# Altium footprint library Cty1.PcbLib: 1378 footprints (part 32 of 87)
Each footprint in its own frame and in the unit in brackets; x right, y up, seen from the top. Pads: shape width x height; smd on the part's side, far side on the other; paste and mask are expansions set on the pad; w line width, h text height; cw(c..) or ccw(c..) is an arc to the next point about the centre after c.
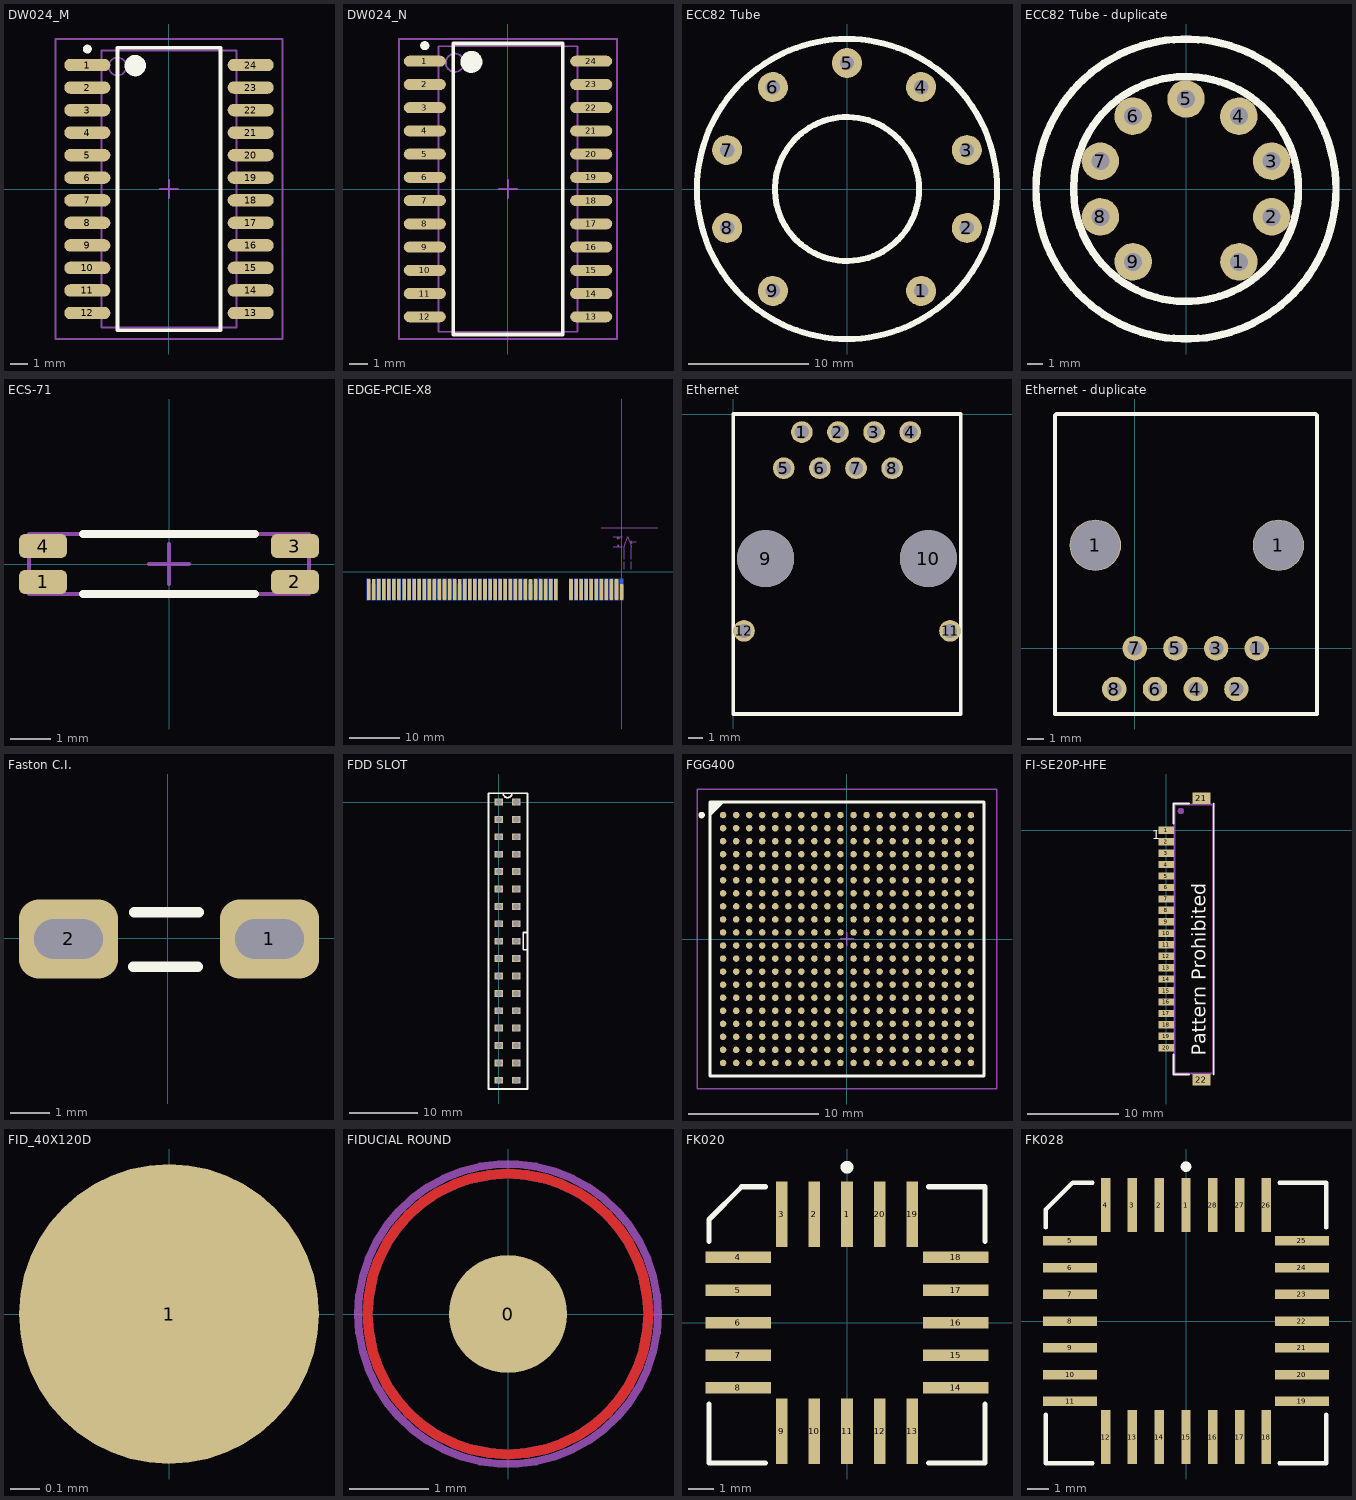
[diagram p31: the footprints below, top view; thin cyan lines are the x and y axes]

## DW024_M [mm] "SOIC, 24-Leads, Body 15.4x7.5mm, Pitch 1.27mm, IPC Low Density"
height 2.65
pads (24):
  oval 2.6x0.7 smd: 1(-4.6,6.985) 2(-4.6,5.715) 3(-4.6,4.445) 4(-4.6,3.175) 5(-4.6,1.905) 6(-4.6,0.635) 7(-4.6,-0.635) 8(-4.6,-1.905) 9(-4.6,-3.175) 10(-4.6,-4.445) 11(-4.6,-5.715) 12(-4.6,-6.985) 13(4.6,-6.985) 14(4.6,-5.715) 15(4.6,-4.445) 16(4.6,-3.175) 17(4.6,-1.905) 18(4.6,-0.635) 19(4.6,0.635) 20(4.6,1.905) 21(4.6,3.175) 22(4.6,4.445) 23(4.6,5.715) 24(4.6,6.985)
Top Overlay:
  circle w0.25: c-4.6,7.885 r0.125
  circle w0.6: c-1.9,6.95 r0.3
  lines w0.2: -2.9,-7.95 -2.9,7.95 2.9,7.95 2.9,-7.95 -2.9,-7.95
Mechanical 13:
  circle w0.1: c-2.9,6.9 r0.5
  lines w0.1: -3.8,-7.8 -3.8,7.8 3.8,7.8 3.8,-7.8 -3.8,-7.8
Mechanical 15:
  lines w0.1: -0.5,0 0.5,0 ; 0,-0.5 0,0.5 ; -6.4,-8.45 -6.4,8.45 6.4,8.45 6.4,-8.45 -6.4,-8.45
3D body: height 2.65, standoff 0, extent -3.8,-7.8 3.8,7.8

## DW024_N [mm] "SOIC, 24-Leads, Body 15.4x7.5mm, Pitch 1.27mm, IPC Medium Density"
height 2.65
pads (24):
  oval 2.3x0.6 smd: 1(-4.55,6.985) 2(-4.55,5.715) 3(-4.55,4.445) 4(-4.55,3.175) 5(-4.55,1.905) 6(-4.55,0.635) 7(-4.55,-0.635) 8(-4.55,-1.905) 9(-4.55,-3.175) 10(-4.55,-4.445) 11(-4.55,-5.715) 12(-4.55,-6.985) 13(4.55,-6.985) 14(4.55,-5.715) 15(4.55,-4.445) 16(4.55,-3.175) 17(4.55,-1.905) 18(4.55,-0.635) 19(4.55,0.635) 20(4.55,1.905) 21(4.55,3.175) 22(4.55,4.445) 23(4.55,5.715) 24(4.55,6.985)
Top Overlay:
  circle w0.6: c-2,6.95 r0.3
  circle w0.25: c-4.55,7.835 r0.125
  lines w0.2: -3,-7.95 3,-7.95 3,7.95 -3,7.95 -3,-7.95
Mechanical 13:
  circle w0.1: c-2.9,6.9 r0.5
  lines w0.1: -3.8,-7.8 3.8,-7.8 3.8,7.8 -3.8,7.8 -3.8,-7.8
Mechanical 15:
  lines w0.1: -0.5,0 0.5,0 ; 0,-0.5 0,0.5 ; -5.95,-8.2 5.95,-8.2 5.95,8.2 -5.95,8.2 -5.95,-8.2
3D body: height 2.65, standoff 0, extent -3.8,-7.8 3.8,7.8

## ECC82 Tube [mm]
pads (9):
  round 2.5 hole 1.2: 1(6.172,-8.495) 2(9.986,-3.245) 3(9.986,3.245) 4(6.172,8.495) 5(0,10.5) 6(-6.172,8.495) 7(-9.986,3.245) 8(-9.986,-3.245) 9(-6.172,-8.495)
Top Overlay:
  circle w0.5: c0,0 r12.5
  circle w0.5: c0,0 r6
3D body "Part26.STEP": height 70.12, standoff -5.7, extent -12.5,-12.5 12.5,12.5

## ECC82 Tube - duplicate [mm]
pads (9):
  round 2.5 hole 1.2: 1(3.527,-4.854) 2(5.706,-1.854) 3(5.706,1.854) 4(3.527,4.854) 5(0,6) 6(-3.527,4.854) 7(-5.706,1.854) 8(-5.706,-1.854) 9(-3.527,-4.854)
Top Overlay:
  circle w0.5: c0,0 r10
  circle w0.5: c0,0 r7.5
3D body "Part24.STEP": height 67.12, standoff -4.8, extent -12.5,-12.5 12.5,12.5

## ECS-71 [mm]
pads (4):
  rrect50% 1.2x0.6 smd: 1(-3.15,-0.45) 2(3.15,-0.45) 3(3.15,0.45) 4(-3.15,0.45)
Top Overlay:
  lines w0.2: -2.15,-0.75 2.15,-0.75 ; -2.15,0.75 2.15,0.75
Mechanical 13:
  lines w0.1: -3.5,-0.75 3.5,-0.75 3.5,0.75 -3.5,0.75 -3.5,-0.75
Mechanical 15:
  lines w0.1: -0.5,0 0.5,0 ; 0,-0.5 0,0.5
3D body: height 1.41, standoff 1.39, extent 1.617,-0.465 2.676,0.536
3D body: height 1.41, standoff 1.39, extent -2.76,-0.49 -1.701,0.511
3D body: height 0.3, standoff 0, extent 3.162,-0.676 3.553,-0.396
3D body: height 0.3, standoff 0, extent 3.162,0.389 3.553,0.668
3D body: height 0.3, standoff 0, extent -3.574,-0.681 -3.183,-0.401
3D body: height 0.3, standoff 0, extent -3.589,0.389 -3.198,0.668
3D body: height 1.4, standoff 0, extent -3.556,-0.749 3.414,0.737

## EDGE-PCIE-X8 [mm]
pads (98):
  rrect50% 0.7x3.2 smd paste-3.2: A1(0,-4)
  rrect50% 0.7x4.2 smd paste-4.2: A2(-1,-3.5) A3(-2,-3.5) A4(-3,-3.5) A5(-4,-3.5) A6(-5,-3.5) A7(-6,-3.5) A8(-7,-3.5) A9(-8,-3.5) A10(-9,-3.5) A11(-10,-3.5) A12(-13,-3.5) A13(-14,-3.5) A14(-15,-3.5) A15(-16,-3.5) A16(-17,-3.5) A17(-18,-3.5) A18(-19,-3.5) A19(-20,-3.5) A20(-21,-3.5) A21(-22,-3.5) A22(-23,-3.5) A23(-24,-3.5) A24(-25,-3.5) A25(-26,-3.5) A26(-27,-3.5) A27(-28,-3.5) A28(-29,-3.5) A29(-30,-3.5) A30(-31,-3.5) A31(-32,-3.5) A32(-33,-3.5) A33(-34,-3.5) A34(-35,-3.5) A35(-36,-3.5) A36(-37,-3.5) A37(-38,-3.5) A38(-39,-3.5) A39(-40,-3.5) A40(-41,-3.5) A41(-42,-3.5) A42(-43,-3.5) A43(-44,-3.5) A44(-45,-3.5) A45(-46,-3.5) A46(-47,-3.5) A47(-48,-3.5) A48(-49,-3.5) A49(-50,-3.5)
  rrect0% 0.7x4.2 smd far side paste-4.2: B1(0,-3.5) B2(-1,-3.5) B3(-2,-3.5) B4(-3,-3.5) B5(-4,-3.5) B6(-5,-3.5) B7(-6,-3.5) B8(-7,-3.5) B9(-8,-3.5) B10(-9,-3.5) B11(-10,-3.5) B12(-13,-3.5) B13(-14,-3.5) B14(-15,-3.5) B15(-16,-3.5) B16(-17,-3.5) B18(-19,-3.5) B19(-20,-3.5) B20(-21,-3.5) B21(-22,-3.5) B22(-23,-3.5) B23(-24,-3.5) B24(-25,-3.5) B25(-26,-3.5) B26(-27,-3.5) B27(-28,-3.5) B28(-29,-3.5) B29(-30,-3.5) B30(-31,-3.5) B32(-33,-3.5) B33(-34,-3.5) B34(-35,-3.5) B35(-36,-3.5) B36(-37,-3.5) B37(-38,-3.5) B38(-39,-3.5) B39(-40,-3.5) B40(-41,-3.5) B41(-42,-3.5) B42(-43,-3.5) B43(-44,-3.5) B44(-45,-3.5) B45(-46,-3.5) B46(-47,-3.5) B47(-48,-3.5) B49(-50,-3.5)
  rrect0% 0.7x3.2 smd far side paste-3.2: B17(-18,-4) B31(-32,-4) B48(-49,-4)
Mechanical 1:
  lines w0.127: -4,8.7 7.2,8.7 ; -1.6,5 0.1,5 ; -1.6,6.9 0.1,6.9 ; -0.9,5.3 -0.7,5.1 ; -0.9,6.6 -0.7,6.8 ; -0.7,5.4 -0.7,5.1 ; -0.7,6.4 -0.7,6.8 ; -0.5,5.3 -0.7,5.1 ; -0.5,6.6 -0.7,6.8 ; 0.5,0.5 0.5,2 ; 0.5,2.5 0.5,5 1.194,6.908 ; 1.207,6.903 1.9,5 1.9,2.5 ; 1.9,0.5 1.9,2 ; 2,5.7 1.8,5.9 ; 2,6.1 1.8,5.9 ; 2.9,5.9 1.8,5.9 ; -0.7,5 -0.7,5
  text "Edge Connector Side View" at -4,8.3 h1
  text "20° ± 5°" at 3.1,6.2 h1
  text "1.4mm" at -2.5,6.2 h1
  text "Board Thickness =1.57 ± 0.10 mm" at 2.5,1.5 h1

## Ethernet [mil] "jac ethernet"
height 551.18
pads (12):
  round 60 hole 39.37: 1(190,-50) 2(290,-50) 3(390,-50) 4(490,-50) 5(140,-150) 6(240,-150) 7(340,-150) 8(440,-150) 11(600,-600) 12(30,-600)
  round 157.48 hole 157.48: 9(90,-400) 10(540,-400)
Top Overlay:
  lines w10: 0,-830 630,-830 630,0 0,0 0,-830

## Ethernet - duplicate [mm]
pads (10):
  round 3.2 hole 3.1: 1(-2.455,6.43) 1(8.975,6.43)
  round 1.524 hole 0.9: 1(7.62,0) 2(6.35,-2.54) 3(5.08,0) 4(3.81,-2.54) 5(2.54,0) 6(1.27,-2.54) 7(0,0) 8(-1.27,-2.54)
Top Overlay:
  lines w0.254: -4.975,-4.1 11.383,-4.1 11.383,14.522 11.279,14.625 3.575,14.625 -4.872,14.625 -4.975,14.522 -4.975,-4.1
3D body "SW3dPS-432028816.STEP": height 12.43, standoff -3.34, extent -4.975,-4.122 11.383,14.522

## Faston C.I. [mm]
pads (2):
  rrect50% 2.5x2 hole 1 slot 1.73 at 0 deg: 1(2.575,-0.025) 2(-2.5,-0.025)
Top Overlay:
  lines w0.254: -0.875,-0.725 0.775,-0.725 ; -0.85,0.65 0.8,0.65
3D body "amp faston tab 63824.step": height 11.52, standoff -2.5, extent -3.925,-1.57 3.995,1.52

## FDD SLOT [mm] "Khe cam cap o dia mem"
pads (34):
  rect 1.27x1 hole 0.889: 1(0,0) 2(0,-2.54) 3(0,-5.08) 4(0,-7.62) 5(0,-10.16) 6(0,-12.7) 7(0,-15.24) 8(0,-17.78) 9(0,-20.32) 10(0,-22.86) 11(0,-25.4) 12(0,-27.94) 13(0,-30.48) 14(0,-33.02) 15(0,-35.56) 16(0,-38.1) 17(0,-40.64) 18(2.54,-40.64) 19(2.54,-38.1) 20(2.54,-35.56) 21(2.54,-33.02) 22(2.54,-30.48) 23(2.54,-27.94) 24(2.54,-25.4) 25(2.54,-22.86) 26(2.54,-20.32) 27(2.54,-17.78) 28(2.54,-15.24) 29(2.54,-12.7) 30(2.54,-10.16) 31(2.54,-7.62) 32(2.54,-5.08) 33(2.54,-2.54) 34(2.54,0)
Top Overlay:
  lines w0.254: 4.191,-21.59 3.556,-21.59 3.556,-19.05 4.191,-19.05 ; -1.524,-41.91 4.191,-41.91 4.191,1.27 1.524,1.27 0.635,1.27 ccw(c1.27,1.27) 1.905,1.27 1.016,1.27 -1.524,1.27 -1.524,-41.91

## FGG400 [mm]
pads (400):
  round 0.5 smd: A1(-9.5,9.5) A2(-8.5,9.5) A3(-7.5,9.5) A4(-6.5,9.5) A5(-5.5,9.5) A6(-4.5,9.5) A7(-3.5,9.5) A8(-2.5,9.5) A9(-1.5,9.5) A10(-0.5,9.5) A11(0.5,9.5) A12(1.5,9.5) A13(2.5,9.5) A14(3.5,9.5) A15(4.5,9.5) A16(5.5,9.5) A17(6.5,9.5) A18(7.5,9.5) A19(8.5,9.5) A20(9.5,9.5) B1(-9.5,8.5) B2(-8.5,8.5) B3(-7.5,8.5) B4(-6.5,8.5) B5(-5.5,8.5) B6(-4.5,8.5) B7(-3.5,8.5) B8(-2.5,8.5) B9(-1.5,8.5) B10(-0.5,8.5) B11(0.5,8.5) B12(1.5,8.5) B13(2.5,8.5) B14(3.5,8.5) B15(4.5,8.5) B16(5.5,8.5) B17(6.5,8.5) B18(7.5,8.5) B19(8.5,8.5) B20(9.5,8.5) C1(-9.5,7.5) C2(-8.5,7.5) C3(-7.5,7.5) C4(-6.5,7.5) C5(-5.5,7.5) C6(-4.5,7.5) C7(-3.5,7.5) C8(-2.5,7.5) C9(-1.5,7.5) C10(-0.5,7.5) C11(0.5,7.5) C12(1.5,7.5) C13(2.5,7.5) C14(3.5,7.5) C15(4.5,7.5) C16(5.5,7.5) C17(6.5,7.5) C18(7.5,7.5) C19(8.5,7.5) C20(9.5,7.5) D1(-9.5,6.5) D2(-8.5,6.5) D3(-7.5,6.5) D4(-6.5,6.5) D5(-5.5,6.5) D6(-4.5,6.5) D7(-3.5,6.5) D8(-2.5,6.5) D9(-1.5,6.5) D10(-0.5,6.5) D11(0.5,6.5) D12(1.5,6.5) D13(2.5,6.5) D14(3.5,6.5) D15(4.5,6.5) D16(5.5,6.5) D17(6.5,6.5) D18(7.5,6.5) D19(8.5,6.5) D20(9.5,6.5) E1(-9.5,5.5) E2(-8.5,5.5) E3(-7.5,5.5) E4(-6.5,5.5) E5(-5.5,5.5) E6(-4.5,5.5) E7(-3.5,5.5) E8(-2.5,5.5) E9(-1.5,5.5) E10(-0.5,5.5) E11(0.5,5.5) E12(1.5,5.5) E13(2.5,5.5) E14(3.5,5.5) E15(4.5,5.5) E16(5.5,5.5) E17(6.5,5.5) E18(7.5,5.5) E19(8.5,5.5) E20(9.5,5.5) F1(-9.5,4.5) F2(-8.5,4.5) F3(-7.5,4.5) F4(-6.5,4.5) F5(-5.5,4.5) F6(-4.5,4.5) F7(-3.5,4.5) F8(-2.5,4.5) F9(-1.5,4.5) F10(-0.5,4.5) F11(0.5,4.5) F12(1.5,4.5) F13(2.5,4.5) F14(3.5,4.5) F15(4.5,4.5) F16(5.5,4.5) F17(6.5,4.5) F18(7.5,4.5) F19(8.5,4.5) F20(9.5,4.5) G1(-9.5,3.5) G2(-8.5,3.5) G3(-7.5,3.5) G4(-6.5,3.5) G5(-5.5,3.5) G6(-4.5,3.5) G7(-3.5,3.5) G8(-2.5,3.5) G9(-1.5,3.5) G10(-0.5,3.5) G11(0.5,3.5) G12(1.5,3.5) G13(2.5,3.5) G14(3.5,3.5) G15(4.5,3.5) G16(5.5,3.5) G17(6.5,3.5) G18(7.5,3.5) G19(8.5,3.5) G20(9.5,3.5) H1(-9.5,2.5) H2(-8.5,2.5) H3(-7.5,2.5) H4(-6.5,2.5) H5(-5.5,2.5) H6(-4.5,2.5) H7(-3.5,2.5) H8(-2.5,2.5) H9(-1.5,2.5) H10(-0.5,2.5) H11(0.5,2.5) H12(1.5,2.5) H13(2.5,2.5) H14(3.5,2.5) H15(4.5,2.5) H16(5.5,2.5) H17(6.5,2.5) H18(7.5,2.5) H19(8.5,2.5) H20(9.5,2.5) J1(-9.5,1.5) J2(-8.5,1.5) J3(-7.5,1.5) J4(-6.5,1.5) J5(-5.5,1.5) J6(-4.5,1.5) J7(-3.5,1.5) J8(-2.5,1.5) J9(-1.5,1.5) J10(-0.5,1.5) J11(0.5,1.5) J12(1.5,1.5) J13(2.5,1.5) J14(3.5,1.5) J15(4.5,1.5) J16(5.5,1.5) J17(6.5,1.5) J18(7.5,1.5) J19(8.5,1.5) J20(9.5,1.5) K1(-9.5,0.5) K2(-8.5,0.5) K3(-7.5,0.5) K4(-6.5,0.5) K5(-5.5,0.5) K6(-4.5,0.5) K7(-3.5,0.5) K8(-2.5,0.5) K9(-1.5,0.5) K10(-0.5,0.5) K11(0.5,0.5) K12(1.5,0.5) K13(2.5,0.5) K14(3.5,0.5) K15(4.5,0.5) K16(5.5,0.5) K17(6.5,0.5) K18(7.5,0.5) K19(8.5,0.5) K20(9.5,0.5) L1(-9.5,-0.5) L2(-8.5,-0.5) L3(-7.5,-0.5) L4(-6.5,-0.5) L5(-5.5,-0.5) L6(-4.5,-0.5) L7(-3.5,-0.5) L8(-2.5,-0.5) L9(-1.5,-0.5) L10(-0.5,-0.5) L11(0.5,-0.5) L12(1.5,-0.5) L13(2.5,-0.5) L14(3.5,-0.5) L15(4.5,-0.5) L16(5.5,-0.5) L17(6.5,-0.5) L18(7.5,-0.5) L19(8.5,-0.5) L20(9.5,-0.5) M1(-9.5,-1.5) M2(-8.5,-1.5) M3(-7.5,-1.5) M4(-6.5,-1.5) M5(-5.5,-1.5) M6(-4.5,-1.5) M7(-3.5,-1.5) M8(-2.5,-1.5) M9(-1.5,-1.5) M10(-0.5,-1.5) M11(0.5,-1.5) M12(1.5,-1.5) M13(2.5,-1.5) M14(3.5,-1.5) M15(4.5,-1.5) M16(5.5,-1.5) M17(6.5,-1.5) M18(7.5,-1.5) M19(8.5,-1.5) M20(9.5,-1.5) N1(-9.5,-2.5) N2(-8.5,-2.5) N3(-7.5,-2.5) N4(-6.5,-2.5) N5(-5.5,-2.5) N6(-4.5,-2.5) N7(-3.5,-2.5) N8(-2.5,-2.5) N9(-1.5,-2.5) N10(-0.5,-2.5) N11(0.5,-2.5) N12(1.5,-2.5) N13(2.5,-2.5) N14(3.5,-2.5) N15(4.5,-2.5) N16(5.5,-2.5) N17(6.5,-2.5) N18(7.5,-2.5) N19(8.5,-2.5) N20(9.5,-2.5) P1(-9.5,-3.5) P2(-8.5,-3.5) P3(-7.5,-3.5) P4(-6.5,-3.5) P5(-5.5,-3.5) P6(-4.5,-3.5) P7(-3.5,-3.5) P8(-2.5,-3.5) P9(-1.5,-3.5) P10(-0.5,-3.5) P11(0.5,-3.5) P12(1.5,-3.5) P13(2.5,-3.5) P14(3.5,-3.5) P15(4.5,-3.5) P16(5.5,-3.5) P17(6.5,-3.5) P18(7.5,-3.5) P19(8.5,-3.5) P20(9.5,-3.5) R1(-9.5,-4.5) R2(-8.5,-4.5) R3(-7.5,-4.5) R4(-6.5,-4.5) R5(-5.5,-4.5) R6(-4.5,-4.5) R7(-3.5,-4.5) R8(-2.5,-4.5) R9(-1.5,-4.5) R10(-0.5,-4.5) R11(0.5,-4.5) R12(1.5,-4.5) R13(2.5,-4.5) R14(3.5,-4.5) R15(4.5,-4.5) R16(5.5,-4.5) R17(6.5,-4.5) R18(7.5,-4.5) R19(8.5,-4.5) R20(9.5,-4.5) T1(-9.5,-5.5) T2(-8.5,-5.5) T3(-7.5,-5.5) T4(-6.5,-5.5) T5(-5.5,-5.5) T6(-4.5,-5.5) T7(-3.5,-5.5) T8(-2.5,-5.5) T9(-1.5,-5.5) T10(-0.5,-5.5) T11(0.5,-5.5) T12(1.5,-5.5) T13(2.5,-5.5) T14(3.5,-5.5) T15(4.5,-5.5) T16(5.5,-5.5) T17(6.5,-5.5) T18(7.5,-5.5) T19(8.5,-5.5) T20(9.5,-5.5) U1(-9.5,-6.5) U2(-8.5,-6.5) U3(-7.5,-6.5) U4(-6.5,-6.5) U5(-5.5,-6.5) U6(-4.5,-6.5) U7(-3.5,-6.5) U8(-2.5,-6.5) U9(-1.5,-6.5) U10(-0.5,-6.5) U11(0.5,-6.5) U12(1.5,-6.5) U13(2.5,-6.5) U14(3.5,-6.5) U15(4.5,-6.5) U16(5.5,-6.5) U17(6.5,-6.5) U18(7.5,-6.5) U19(8.5,-6.5) U20(9.5,-6.5) V1(-9.5,-7.5) V2(-8.5,-7.5) V3(-7.5,-7.5) V4(-6.5,-7.5) V5(-5.5,-7.5) V6(-4.5,-7.5) V7(-3.5,-7.5) V8(-2.5,-7.5) V9(-1.5,-7.5) V10(-0.5,-7.5) V11(0.5,-7.5) V12(1.5,-7.5) V13(2.5,-7.5) V14(3.5,-7.5) V15(4.5,-7.5) V16(5.5,-7.5) V17(6.5,-7.5) V18(7.5,-7.5) V19(8.5,-7.5) V20(9.5,-7.5) W1(-9.5,-8.5) W2(-8.5,-8.5) W3(-7.5,-8.5) W4(-6.5,-8.5) W5(-5.5,-8.5) W6(-4.5,-8.5) W7(-3.5,-8.5) W8(-2.5,-8.5) W9(-1.5,-8.5) W10(-0.5,-8.5) W11(0.5,-8.5) W12(1.5,-8.5) W13(2.5,-8.5) W14(3.5,-8.5) W15(4.5,-8.5) W16(5.5,-8.5) W17(6.5,-8.5) W18(7.5,-8.5) W19(8.5,-8.5) W20(9.5,-8.5) Y1(-9.5,-9.5) Y2(-8.5,-9.5) Y3(-7.5,-9.5) Y4(-6.5,-9.5) Y5(-5.5,-9.5) Y6(-4.5,-9.5) Y7(-3.5,-9.5) Y8(-2.5,-9.5) Y9(-1.5,-9.5) Y10(-0.5,-9.5) Y11(0.5,-9.5) Y12(1.5,-9.5) Y13(2.5,-9.5) Y14(3.5,-9.5) Y15(4.5,-9.5) Y16(5.5,-9.5) Y17(6.5,-9.5) Y18(7.5,-9.5) Y19(8.5,-9.5) Y20(9.5,-9.5)
Top Overlay:
  circle w0.25: c-11.15,9.5 r0.125
  region: -9.5,10.5 -10.5,9.5 -10.5,10.5
  lines w0.2: -10.5,9.5 -9.5,10.5 ; -10.5,-10.5 -10.5,10.5 10.5,10.5 10.5,-10.5 -10.5,-10.5
Mechanical 13:
  lines w0.1: -10.5,-10.5 10.5,-10.5 10.5,10.5 -10.5,10.5 -10.5,-10.5
Mechanical 15:
  lines w0.1: -0.5,0 0.5,0 ; 0,-0.5 0,0.5 ; -11.5,-11.5 11.5,-11.5 11.5,11.5 -11.5,11.5 -11.5,-11.5
3D body: height 2.43, standoff 0, extent -10.5,-10.5 10.5,10.5

## FI-SE20P-HFE [mm] "Creator MM"
height 1.96
pads (22):
  rect 1.7x0.8 smd: 1(0,0) 2(0,-1.25) 3(0,-2.5) 4(0,-3.75) 5(0,-5) 6(0,-6.25) 7(0,-7.5) 8(0,-8.75) 9(0,-10) 10(0,-11.25) 11(0,-12.5) 12(0,-13.75) 13(0,-15) 14(0,-16.25) 15(0,-17.5) 16(0,-18.75) 17(0,-20) 18(0,-21.25) 19(0,-22.5) 20(0,-23.75)
  rect 2x1.25 smd: 21(3.85,3.5) 22(3.85,-27.25)
Top Overlay:
  lines w0.2: 0.8,-24.45 0.8,-26.65 2.5,-26.65 ; 0.8,0.7 0.8,2.9 2.5,2.9 ; 5.2,-26.65 5.2,2.9
  text "Pattern Prohibited" at 4.3,-24.6 h1.52
  text "1" at -1.5,-1 h1.02
Mechanical 16:
  circle w0.5: c1.6,2.1 r0.1
  lines w0.2: 0.9,-26.55 5.1,-26.55 5.1,2.8 0.9,2.8 0.9,-26.55
Mechanical 29:
  text ".Designator" at 2.2,-10.5 h1.52
3D body "K3D-FI-SE20P-HFE-R1.STEP": height 2.11, standoff 0, extent -0.25,-27.275 5.1,3.475

## FID_40X120D [mil]
pads (1):
  round 40 smd paste-40 mask+40: 1(0,0)

## FIDUCIAL ROUND [mm]
pads (1):
  round 1.5 all layers, no hole paste-1.524 mask+1.1: 0(0,0)
Top Layer:
  circle w0.127: c0,0 r1.778
Bottom Layer:
  circle w0.127: c0,0 r1.778
Mechanical 1:
  circle w0.1: c0,0 r1.9

## FK020 [mm] "Leadless Chip Carrier; 20 Terminals; Body 8.9 x 8.9 mm"
height 2.03
pads (20):
  rect 0.45x2.55 smd: 1(0,4.225) 2(-1.27,4.225) 3(-2.54,4.225) 9(-2.54,-4.225) 10(-1.27,-4.225) 11(0,-4.225) 12(1.27,-4.225) 13(2.54,-4.225) 19(2.54,4.225) 20(1.27,4.225)
  rect 2.55x0.45 smd: 4(-4.225,2.54) 5(-4.225,1.27) 6(-4.225,0) 7(-4.225,-1.27) 8(-4.225,-2.54) 14(4.225,-2.54) 15(4.225,-1.27) 16(4.225,0) 17(4.225,1.27) 18(4.225,2.54)
Top Overlay:
  circle w0.25: c0,6.05 r0.125
  lines w0.2: -5.375,-3.165 -5.375,-5.463 -3.165,-5.463 ; -5.375,3.165 -5.375,4.012 -4.1,5.288 -3.165,5.288 ; 3.165,-5.463 5.375,-5.463 5.375,-3.165 ; 3.165,5.288 5.375,5.288 5.375,3.165

## FK028 [mm] "Leadless Chip Carrier; 28 Terminals; Body 11.4 x 11.4 mm"
height 2.03
pads (28):
  rect 0.45x2.55 smd: 1(0,5.5) 2(-1.27,5.5) 3(-2.54,5.5) 4(-3.81,5.5) 12(-3.81,-5.5) 13(-2.54,-5.5) 14(-1.27,-5.5) 15(0,-5.5) 16(1.27,-5.5) 17(2.54,-5.5) 18(3.81,-5.5) 26(3.81,5.5) 27(2.54,5.5) 28(1.27,5.5)
  rect 2.55x0.45 smd: 5(-5.5,3.81) 6(-5.5,2.54) 7(-5.5,1.27) 8(-5.5,0) 9(-5.5,-1.27) 10(-5.5,-2.54) 11(-5.5,-3.81) 19(5.5,-3.81) 20(5.5,-2.54) 21(5.5,-1.27) 22(5.5,0) 23(5.5,1.27) 24(5.5,2.54) 25(5.5,3.81)
Top Overlay:
  circle w0.25: c0,7.325 r0.125
  lines w0.2: -6.65,-4.435 -6.65,-6.737 -4.435,-6.737 ; -6.65,4.435 -6.65,5.288 -5.375,6.563 -4.435,6.562 ; 4.435,-6.737 6.65,-6.737 6.65,-4.435 ; 4.435,6.562 6.65,6.562 6.65,4.435